# Altium footprint library SMD_Bauteile.PcbLib: 355 footprints (part 5 of 23)
Each footprint in its own frame and in the unit in brackets; x right, y up, seen from the top. Pads: shape width x height; smd on the part's side, far side on the other; paste and mask are expansions set on the pad; w line width, h text height; cw(c..) or ccw(c..) is an arc to the next point about the centre after c.
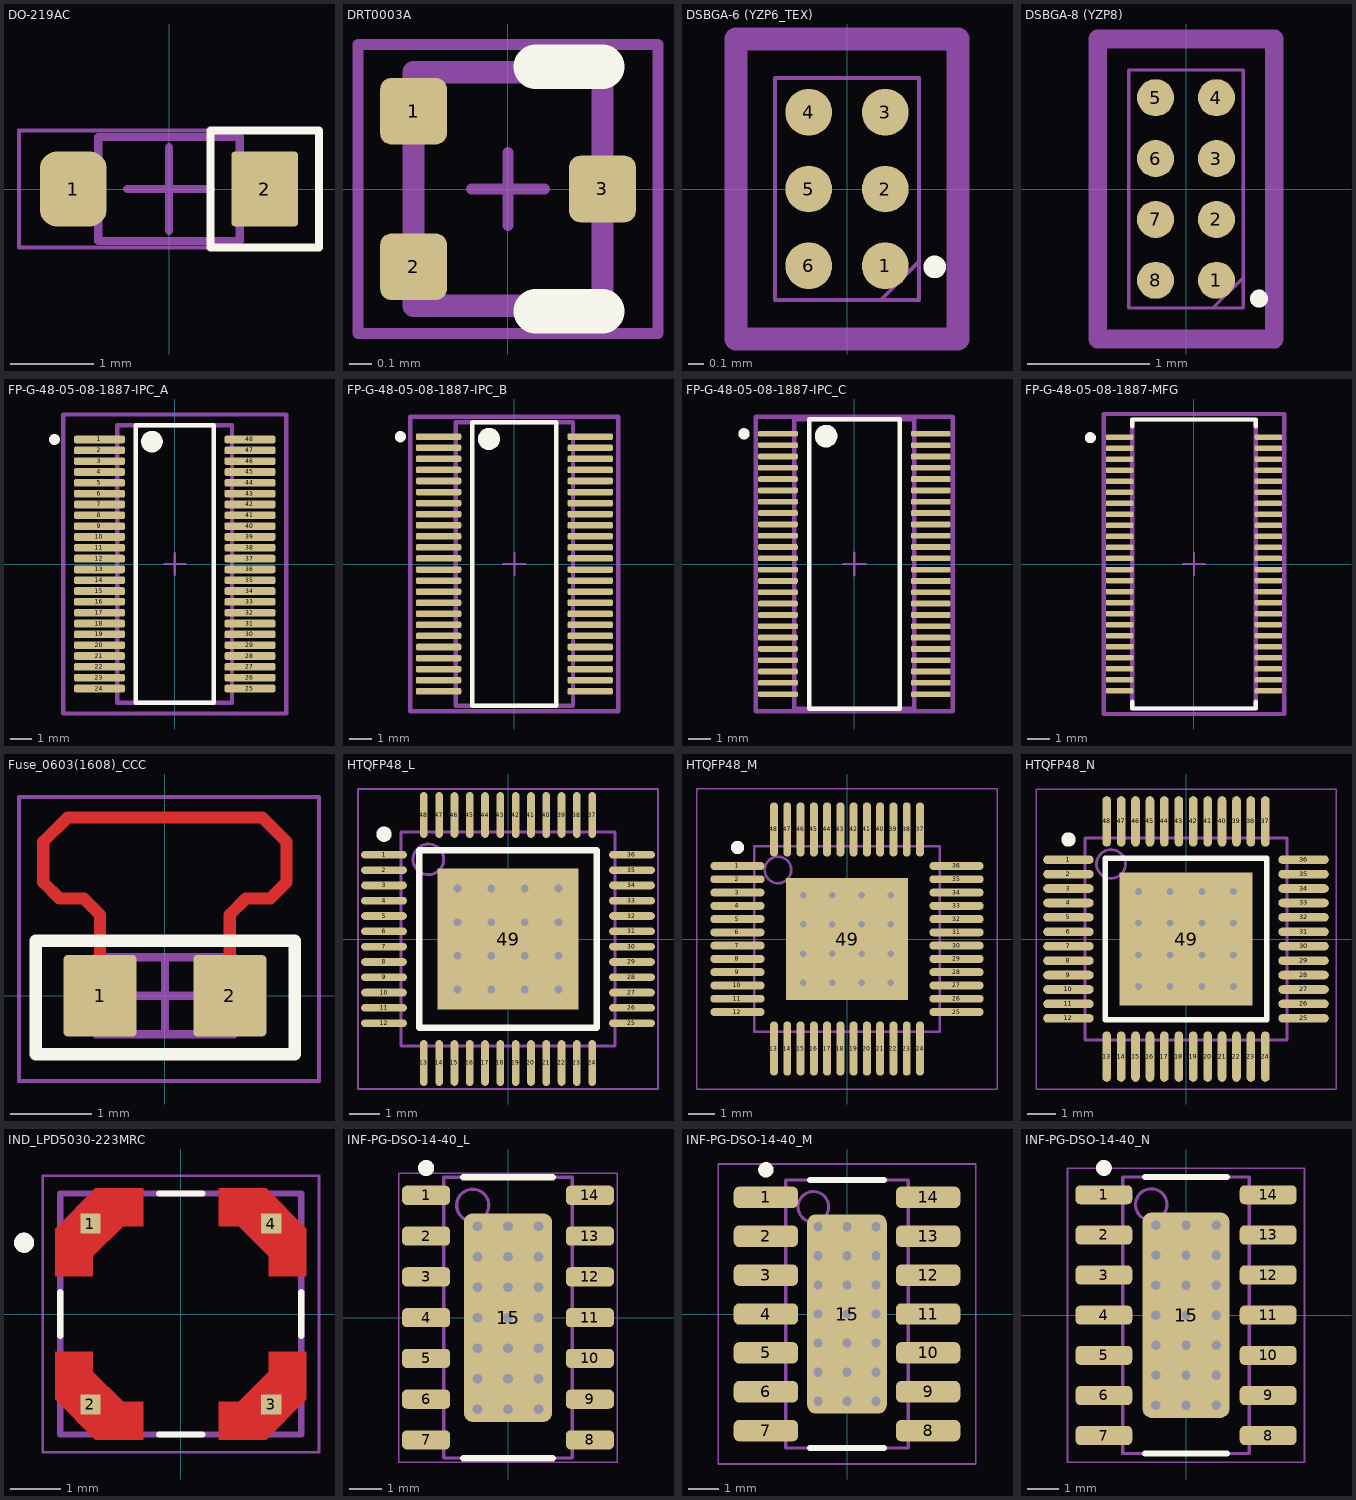
[diagram p4: the footprints below, top view; thin cyan lines are the x and y axes]

## DO-219AC [mm]
height 1.062
pads (2):
  rrect50% 0.8x0.9 smd: 1(-1.15,0)
  rrect10% 0.8x0.9 smd: 2(1.15,0)
Top Overlay:
  lines w0.1: 0.498,-0.702 1.802,-0.702 1.802,0.702 0.498,0.702 0.498,-0.702
Top Component Center:
  lines w0.1: -0.5,0 0.5,0 ; 0,-0.5 0,0.5
Top Component Outline:
  lines w0.1: -0.85,-0.625 -0.85,0.625 0.85,0.625 0.85,-0.625 -0.85,-0.625
Top Courtyard (Mech26):
  lines w0.05: -1.802,-0.702 -1.802,0.702 1.802,0.702 1.802,-0.702 -1.802,-0.702
3D body: height 0.6, standoff 0, extent -0.85,-0.625 0.85,0.625

## DRT0003A [mm] "SOTFL, 3-Leads, Body 1x1mm (inc leads), Pitch 0.35mm"
height 0.5
pads (3):
  rrect33% 0.3x0.3 smd: 1(-0.425,0.35) 2(-0.425,-0.35) 3(0.425,0)
Top Overlay:
  lines w0.2: 0.125,-0.55 0.425,-0.55 ; 0.125,0.55 0.425,0.55
Mechanical 1:
  text ".Designator" at -0.127,0.381 h0.2
Mech Misc 1:
  lines w0.1: -0.425,-0.525 -0.425,0.525 0.425,0.525 0.425,-0.525 -0.425,-0.525
Mech 15:
  lines w0.05: -0.165,0 0.165,0 ; 0,-0.165 0,0.165 ; -0.675,-0.65 0.675,-0.65 0.675,0.65 -0.675,0.65 -0.675,-0.65
3D body "SOTFL35P100X50-3L.step": height 0.5, standoff 0, extent -0.5,-0.498 0.5,0.498

## DSBGA-6 (YZP6_TEX) [mil]
height 19.68
pads (6):
  round 12 smd paste+0 mask+0: 1(9.84,-19.68) 2(9.84,0) 3(9.84,19.68) 4(-9.84,19.68) 5(-9.84,0) 6(-9.84,-19.68)
Top Overlay:
  circle w5: c22.5,-20 r0.39
Mech Misc 1:
  lines w1: 8.66,-28.5 18.5,-18.66 ; -18.5,-28.5 -18.5,28.5 18.5,28.5 18.5,-28.5 -18.5,-28.5
Mech 15:
  lines w6: -28.5,-38.5 28.5,-38.5 28.5,38.5 -28.5,38.5 -28.5,-38.5
3D body: height 10, standoff 0, extent 0,0 10,10
3D body "YZP6_TEX.step": height 20.12, standoff -0.02, extent -18.5,-28.5 18.51,28.51

## DSBGA-8 (YZP8) [mm]
height 0.5
pads (8):
  round 0.305 smd: 1(0.25,-0.75) 2(0.25,-0.25) 3(0.25,0.25) 4(0.25,0.75) 5(-0.25,0.75) 6(-0.25,0.25) 7(-0.25,-0.25) 8(-0.25,-0.75)
Top Overlay:
  circle w0.127: c0.6,-0.9 r0.01
Mech Misc 1:
  lines w0.025: 0.22,-0.978 0.47,-0.728 ; -0.47,-0.978 0.47,-0.978 0.47,0.978 -0.47,0.978 -0.47,-0.978
Mech 15:
  lines w0.152: -0.724,-1.232 -0.724,1.232 0.724,1.232 0.724,-1.232 -0.724,-1.232
3D body: height 0.25, standoff 0, extent 0,0 0.254,0.254
3D body "YZP8.step": height 0.51, standoff 0, extent -0.47,-0.978 0.47,0.978

## FP-G-48-05-08-1887-IPC_A [mm]
pads (48):
  rrect50% 2.353x0.355 smd: 1(-3.475,5.75) 2(-3.475,5.25) 3(-3.475,4.75) 4(-3.475,4.25) 5(-3.475,3.75) 6(-3.475,3.25) 7(-3.475,2.75) 8(-3.475,2.25) 9(-3.475,1.75) 10(-3.475,1.25) 11(-3.475,0.75) 12(-3.475,0.25) 13(-3.475,-0.25) 14(-3.475,-0.75) 15(-3.475,-1.25) 16(-3.475,-1.75) 17(-3.475,-2.25) 18(-3.475,-2.75) 19(-3.475,-3.25) 20(-3.475,-3.75) 21(-3.475,-4.25) 22(-3.475,-4.75) 23(-3.475,-5.25) 24(-3.475,-5.75) 25(3.475,-5.75) 26(3.475,-5.25) 27(3.475,-4.75) 28(3.475,-4.25) 29(3.475,-3.75) 30(3.475,-3.25) 31(3.475,-2.75) 32(3.475,-2.25) 33(3.475,-1.75) 34(3.475,-1.25) 35(3.475,-0.75) 36(3.475,-0.25) 37(3.475,0.25) 38(3.475,0.75) 39(3.475,1.25) 40(3.475,1.75) 41(3.475,2.25) 42(3.475,2.75) 43(3.475,3.25) 44(3.475,3.75) 45(3.475,4.25) 46(3.475,4.75) 47(3.475,5.25) 48(3.475,5.75)
Top Overlay:
  circle w0.25: c-5.552,5.75 r0.125
  circle w0.5: c-1.049,5.65 r0.25
  lines w0.2: -1.799,-6.4 -1.799,6.4 1.799,6.4 1.799,-6.4 -1.799,-6.4
Top Component Center:
  lines w0.1: -0.5,0 0.5,0 ; 0,-0.5 0,0.5
Top Component Outline:
  lines w0.2: -2.65,-6.4 -2.65,6.4 2.65,6.4 2.65,-6.4 -2.65,-6.4
Top Courtyard (Mech26):
  lines w0.2: -5.152,-6.9 -5.152,6.9 ; -5.152,-6.9 5.152,-6.9 ; -5.152,-6.9 -5.152,6.9 ; -5.152,-6.9 5.152,-6.9 ; -5.152,6.9 5.152,6.9 ; -5.152,6.9 5.152,6.9 ; 5.152,-6.9 5.152,6.9 ; 5.152,-6.9 5.152,6.9
Top Designator:
  text ".Designator" at 0,-0.001 h1
3D body "IC_Analog_Devices_LTC6811HG-1#PBF_eec.STEP": height 1.85, standoff 0, extent -3.9,-6.4 3.9,6.4

## FP-G-48-05-08-1887-IPC_B [mm]
pads (48):
  rrect50% 2.053x0.295 smd paste+0 mask+0.1: 1(-3.425,5.75) 2(-3.425,5.25) 3(-3.425,4.75) 4(-3.425,4.25) 5(-3.425,3.75) 6(-3.425,3.25) 7(-3.425,2.75) 8(-3.425,2.25) 9(-3.425,1.75) 10(-3.425,1.25) 11(-3.425,0.75) 12(-3.425,0.25) 13(-3.425,-0.25) 14(-3.425,-0.75) 15(-3.425,-1.25) 16(-3.425,-1.75) 17(-3.425,-2.25) 18(-3.425,-2.75) 19(-3.425,-3.25) 20(-3.425,-3.75) 21(-3.425,-4.25) 22(-3.425,-4.75) 23(-3.425,-5.25) 24(-3.425,-5.75) 25(3.425,-5.75) 26(3.425,-5.25) 27(3.425,-4.75) 28(3.425,-4.25) 29(3.425,-3.75) 30(3.425,-3.25) 31(3.425,-2.75) 32(3.425,-2.25) 33(3.425,-1.75) 34(3.425,-1.25) 35(3.425,-0.75) 36(3.425,-0.25) 37(3.425,0.25) 38(3.425,0.75) 39(3.425,1.25) 40(3.425,1.75) 41(3.425,2.25) 42(3.425,2.75) 43(3.425,3.25) 44(3.425,3.75) 45(3.425,4.25) 46(3.425,4.75) 47(3.425,5.25) 48(3.425,5.75)
Top Overlay:
  circle w0.25: c-5.152,5.75 r0.125
  circle w0.5: c-1.149,5.65 r0.25
  lines w0.2: -1.899,-6.4 -1.899,6.4 1.899,6.4 1.899,-6.4 -1.899,-6.4
Top Component Center:
  lines w0.1: -0.5,0 0.5,0 ; 0,-0.5 0,0.5
Top Component Outline:
  lines w0.2: -2.65,-6.4 2.65,-6.4 2.65,6.4 -2.65,6.4 -2.65,-6.4
Top Courtyard (Mech26):
  lines w0.2: -4.702,-6.65 -4.702,6.65 ; -4.702,-6.65 4.702,-6.65 ; -4.702,-6.65 -4.702,6.65 ; -4.702,-6.65 4.702,-6.65 ; -4.702,6.65 4.702,6.65 ; -4.702,6.65 4.702,6.65 ; 4.702,-6.65 4.702,6.65 ; 4.702,-6.65 4.702,6.65
Top Designator:
  text ".Designator" at 0,-0.001 h1
3D body "IC_Analog_Devices_LTC6811HG-1#PBF_eec.STEP": height 1.85, standoff 0, extent -3.9,-6.4 3.9,6.4

## FP-G-48-05-08-1887-IPC_C [mm]
pads (48):
  rrect50% 1.753x0.255 smd paste+0: 1(-3.375,5.75) 2(-3.375,5.25) 3(-3.375,4.75) 4(-3.375,4.25) 5(-3.375,3.75) 6(-3.375,3.25) 7(-3.375,2.75) 8(-3.375,2.25) 9(-3.375,1.75) 10(-3.375,1.25) 11(-3.375,0.75) 12(-3.375,0.25) 13(-3.375,-0.25) 14(-3.375,-0.75) 15(-3.375,-1.25) 16(-3.375,-1.75) 17(-3.375,-2.25) 18(-3.375,-2.75) 19(-3.375,-3.25) 20(-3.375,-3.75) 21(-3.375,-4.25) 22(-3.375,-4.75) 23(-3.375,-5.25) 24(-3.375,-5.75) 25(3.375,-5.75) 26(3.375,-5.25) 27(3.375,-4.75) 28(3.375,-4.25) 29(3.375,-3.75) 30(3.375,-3.25) 31(3.375,-2.75) 32(3.375,-2.25) 33(3.375,-1.75) 34(3.375,-1.25) 35(3.375,-0.75) 36(3.375,-0.25) 37(3.375,0.25) 38(3.375,0.75) 39(3.375,1.25) 40(3.375,1.75) 41(3.375,2.25) 42(3.375,2.75) 43(3.375,3.25) 44(3.375,3.75) 45(3.375,4.25) 46(3.375,4.75) 47(3.375,5.25) 48(3.375,5.75)
Top Overlay:
  circle w0.5: c-1.249,5.65 r0.25
  circle w0.25: c-4.877,5.75 r0.125
  lines w0.2: -1.999,-6.4 1.999,-6.4 1.999,6.4 -1.999,6.4 -1.999,-6.4
Top Component Center:
  lines w0.1: -0.5,0 0.5,0 ; 0,-0.5 0,0.5
Top Component Outline:
  lines w0.2: -2.65,-6.4 2.65,-6.4 2.65,6.4 -2.65,6.4 -2.65,-6.4
Top Courtyard (Mech26):
  lines w0.2: -4.352,-6.5 -4.352,6.5 ; -4.352,-6.5 4.352,-6.5 ; -4.352,-6.5 -4.352,6.5 ; -4.352,-6.5 4.352,-6.5 ; -4.352,6.5 4.352,6.5 ; -4.352,6.5 4.352,6.5 ; 4.352,-6.5 4.352,6.5 ; 4.352,-6.5 4.352,6.5
Top Designator:
  text ".Designator" at 0,-0.001 h1
3D body "IC_Analog_Devices_LTC6811HG-1#PBF_eec.STEP": height 1.85, standoff 0, extent -3.9,-6.4 3.9,6.4

## FP-G-48-05-08-1887-MFG [mm]
pads (48):
  rrect50% 1.25x0.25 smd paste+0: 1(-3.375,5.75) 2(-3.375,5.25) 3(-3.375,4.75) 4(-3.375,4.25) 5(-3.375,3.75) 6(-3.375,3.25) 7(-3.375,2.75) 8(-3.375,2.25) 9(-3.375,1.75) 10(-3.375,1.25) 11(-3.375,0.75) 12(-3.375,0.25) 13(-3.375,-0.25) 14(-3.375,-0.75) 15(-3.375,-1.25) 16(-3.375,-1.75) 17(-3.375,-2.25) 18(-3.375,-2.75) 19(-3.375,-3.25) 20(-3.375,-3.75) 21(-3.375,-4.25) 22(-3.375,-4.75) 23(-3.375,-5.25) 24(-3.375,-5.75) 25(3.375,-5.75) 26(3.375,-5.25) 27(3.375,-4.75) 28(3.375,-4.25) 29(3.375,-3.75) 30(3.375,-3.25) 31(3.375,-2.75) 32(3.375,-2.25) 33(3.375,-1.75) 34(3.375,-1.25) 35(3.375,-0.75) 36(3.375,-0.25) 37(3.375,0.25) 38(3.375,0.75) 39(3.375,1.25) 40(3.375,1.75) 41(3.375,2.25) 42(3.375,2.75) 43(3.375,3.25) 44(3.375,3.75) 45(3.375,4.25) 46(3.375,4.75) 47(3.375,5.25) 48(3.375,5.75)
Top Overlay:
  circle w0.25: c-4.7,5.725 r0.125
  lines w0.2: -2.8,-6.25 -2.8,-6.55 2.8,-6.55 2.8,-6.25 ; -2.8,6.25 -2.8,6.55 2.8,6.55 2.8,6.25
Top Component Center:
  lines w0.1: -0.5,0 0.5,0 ; 0,-0.5 0,0.5
Top Component Outline:
  lines w0.2: -2.8,-6.55 2.8,-6.55 2.8,6.55 -2.8,6.55 -2.8,-6.55
Top Courtyard (Mech26):
  lines w0.2: -4.1,-6.8 -4.1,6.8 ; -4.1,-6.8 4.1,-6.8 ; -4.1,-6.8 -4.1,6.8 ; -4.1,-6.8 4.1,-6.8 ; -4.1,6.8 4.1,6.8 ; -4.1,6.8 4.1,6.8 ; 4.1,-6.8 4.1,6.8 ; 4.1,-6.8 4.1,6.8
Top Designator:
  text ".Designator" at 0,0.187 h1
3D body "IC_Analog_Devices_LTC6811HG-1#PBF_eec.STEP": height 1.85, standoff 0, extent -3.9,-6.4 3.9,6.4

## Fuse_0603(1608)_CCC [mm] "Chip Fuse for CCC, 2-Leads, Body 1.60x0.85mm, IPC Low Density"
height 0.55
pads (2):
  rrect10% 0.9x1 smd paste-2539.97: 1(-0.8,0) 2(0.8,0)
Top Layer:
  lines w0.15: -0.8,0 -0.8,1 -1,1.2 -1.3,1.2 -1.5,1.4 -1.5,1.9 -1.2,2.2 1.2,2.2 1.5,1.9 1.5,1.4 1.3,1.2 1,1.2 0.8,1 0.8,0
Top Overlay:
  lines w0.15: -1.593,-0.722 1.6,-0.722 1.6,0.678 -1.593,0.678 -1.593,-0.722
Mech Misc 1:
  lines w0.1: -0.85,-0.475 0.85,-0.475 0.85,0.475 -0.85,0.475 -0.85,-0.475
Mech 15:
  lines w0.05: -1.8,-1.05 -1.8,2.45 1.9,2.45 1.9,-1.05 -1.8,-1.05
  lines w0.1: -0.475,0 0.475,0 ; 0,-0.475 0,0.475
3D body "0438.250WR_simplify.stp": height 0.58, standoff 0, extent -0.77,-0.425 0.77,0.425

## HTQFP48_L [mm] "QFP, 48-Leads, Body 7x7mm, Pitch 0.5mm, Thermal Pad 4.6x4.6mm, IPC High Density"
height 1.2
pads (49):
  oval 1.5x0.25 smd: 1(-4.05,2.75) 2(-4.05,2.25) 3(-4.05,1.75) 4(-4.05,1.25) 5(-4.05,0.75) 6(-4.05,0.25) 7(-4.05,-0.25) 8(-4.05,-0.75) 9(-4.05,-1.25) 10(-4.05,-1.75) 11(-4.05,-2.25) 12(-4.05,-2.75) 25(4.05,-2.75) 26(4.05,-2.25) 27(4.05,-1.75) 28(4.05,-1.25) 29(4.05,-0.75) 30(4.05,-0.25) 31(4.05,0.25) 32(4.05,0.75) 33(4.05,1.25) 34(4.05,1.75) 35(4.05,2.25) 36(4.05,2.75)
  oval 0.25x1.5 smd: 13(-2.75,-4.05) 14(-2.25,-4.05) 15(-1.75,-4.05) 16(-1.25,-4.05) 17(-0.75,-4.05) 18(-0.25,-4.05) 19(0.25,-4.05) 20(0.75,-4.05) 21(1.25,-4.05) 22(1.75,-4.05) 23(2.25,-4.05) 24(2.75,-4.05) 37(2.75,4.05) 38(2.25,4.05) 39(1.75,4.05) 40(1.25,4.05) 41(0.75,4.05) 42(0.25,4.05) 43(-0.25,4.05) 44(-0.75,4.05) 45(-1.25,4.05) 46(-1.75,4.05) 47(-2.25,4.05) 48(-2.75,4.05)
  rect 4.6x4.6 smd: 49(0,0)
via -1.65,1.65 diameter 0.6 hole 0.25
via -0.55,1.65 diameter 0.6 hole 0.25
via 0.55,1.65 diameter 0.6 hole 0.25
via 1.65,1.65 diameter 0.6 hole 0.25
via -1.65,0.55 diameter 0.6 hole 0.25
via -0.55,0.55 diameter 0.6 hole 0.25
via 0.55,0.55 diameter 0.6 hole 0.25
via 1.65,0.55 diameter 0.6 hole 0.25
via -1.65,-0.55 diameter 0.6 hole 0.25
via -0.55,-0.55 diameter 0.6 hole 0.25
via 0.55,-0.55 diameter 0.6 hole 0.25
via 1.65,-0.55 diameter 0.6 hole 0.25
via -1.65,-1.65 diameter 0.6 hole 0.25
via -0.55,-1.65 diameter 0.6 hole 0.25
via 0.55,-1.65 diameter 0.6 hole 0.25
via 1.65,-1.65 diameter 0.6 hole 0.25
Top Overlay:
  circle w0.25: c-4.05,3.425 r0.125
  lines w0.2: -2.9,-2.9 -2.9,2.9 2.9,2.9 2.9,-2.9 -2.9,-2.9
Mech Misc 1:
  circle w0.1: c-2.6,2.6 r0.5
  lines w0.1: -3.5,-3.5 -3.5,3.5 3.5,3.5 3.5,-3.5 -3.5,-3.5
Mech 15:
  lines w0.05: -4.9,-4.9 -4.9,4.9 4.9,4.9 4.9,-4.9 -4.9,-4.9
  lines w0.1: -0.5,0 0.5,0 ; 0,-0.5 0,0.5
3D body: height 1.2, standoff 0.05, extent -3.5,-3.5 3.5,3.5

## HTQFP48_M [mm] "QFP, 48-Leads, Body 7x7mm, Pitch 0.5mm, Thermal Pad 4.6x4.6mm, IPC Low Density"
height 1.2
pads (49):
  oval 2.05x0.3 smd: 1(-4.125,2.75) 2(-4.125,2.25) 3(-4.125,1.75) 4(-4.125,1.25) 5(-4.125,0.75) 6(-4.125,0.25) 7(-4.125,-0.25) 8(-4.125,-0.75) 9(-4.125,-1.25) 10(-4.125,-1.75) 11(-4.125,-2.25) 12(-4.125,-2.75) 25(4.125,-2.75) 26(4.125,-2.25) 27(4.125,-1.75) 28(4.125,-1.25) 29(4.125,-0.75) 30(4.125,-0.25) 31(4.125,0.25) 32(4.125,0.75) 33(4.125,1.25) 34(4.125,1.75) 35(4.125,2.25) 36(4.125,2.75)
  oval 0.3x2.05 smd: 13(-2.75,-4.125) 14(-2.25,-4.125) 15(-1.75,-4.125) 16(-1.25,-4.125) 17(-0.75,-4.125) 18(-0.25,-4.125) 19(0.25,-4.125) 20(0.75,-4.125) 21(1.25,-4.125) 22(1.75,-4.125) 23(2.25,-4.125) 24(2.75,-4.125) 37(2.75,4.125) 38(2.25,4.125) 39(1.75,4.125) 40(1.25,4.125) 41(0.75,4.125) 42(0.25,4.125) 43(-0.25,4.125) 44(-0.75,4.125) 45(-1.25,4.125) 46(-1.75,4.125) 47(-2.25,4.125) 48(-2.75,4.125)
  rect 4.6x4.6 smd: 49(0,0)
via -1.65,1.65 diameter 0.6 hole 0.25
via -0.55,1.65 diameter 0.6 hole 0.25
via 0.55,1.65 diameter 0.6 hole 0.25
via 1.65,1.65 diameter 0.6 hole 0.25
via -1.65,0.55 diameter 0.6 hole 0.25
via -0.55,0.55 diameter 0.6 hole 0.25
via 0.55,0.55 diameter 0.6 hole 0.25
via 1.65,0.55 diameter 0.6 hole 0.25
via -1.65,-0.55 diameter 0.6 hole 0.25
via -0.55,-0.55 diameter 0.6 hole 0.25
via 0.55,-0.55 diameter 0.6 hole 0.25
via 1.65,-0.55 diameter 0.6 hole 0.25
via -1.65,-1.65 diameter 0.6 hole 0.25
via -0.55,-1.65 diameter 0.6 hole 0.25
via 0.55,-1.65 diameter 0.6 hole 0.25
via 1.65,-1.65 diameter 0.6 hole 0.25
Top Overlay:
  circle w0.25: c-4.125,3.45 r0.125
Mech Misc 1:
  circle w0.1: c-2.6,2.6 r0.5
  lines w0.1: -3.5,-3.5 -3.5,3.5 3.5,3.5 3.5,-3.5 -3.5,-3.5
Mech 15:
  lines w0.05: -5.65,-5.65 -5.65,5.65 5.65,5.65 5.65,-5.65 -5.65,-5.65
  lines w0.1: -0.5,0 0.5,0 ; 0,-0.5 0,0.5
3D body: height 1.2, standoff 0.05, extent -3.5,-3.5 3.5,3.5

## HTQFP48_N [mm] "QFP, 48-Leads, Body 7x7mm, Pitch 0.5mm, Thermal Pad 4.6x4.6mm, IPC Medium Density"
height 1.2
pads (49):
  oval 1.75x0.3 smd: 1(-4.075,2.75) 2(-4.075,2.25) 3(-4.075,1.75) 4(-4.075,1.25) 5(-4.075,0.75) 6(-4.075,0.25) 7(-4.075,-0.25) 8(-4.075,-0.75) 9(-4.075,-1.25) 10(-4.075,-1.75) 11(-4.075,-2.25) 12(-4.075,-2.75) 25(4.075,-2.75) 26(4.075,-2.25) 27(4.075,-1.75) 28(4.075,-1.25) 29(4.075,-0.75) 30(4.075,-0.25) 31(4.075,0.25) 32(4.075,0.75) 33(4.075,1.25) 34(4.075,1.75) 35(4.075,2.25) 36(4.075,2.75)
  oval 0.3x1.75 smd: 13(-2.75,-4.075) 14(-2.25,-4.075) 15(-1.75,-4.075) 16(-1.25,-4.075) 17(-0.75,-4.075) 18(-0.25,-4.075) 19(0.25,-4.075) 20(0.75,-4.075) 21(1.25,-4.075) 22(1.75,-4.075) 23(2.25,-4.075) 24(2.75,-4.075) 37(2.75,4.075) 38(2.25,4.075) 39(1.75,4.075) 40(1.25,4.075) 41(0.75,4.075) 42(0.25,4.075) 43(-0.25,4.075) 44(-0.75,4.075) 45(-1.25,4.075) 46(-1.75,4.075) 47(-2.25,4.075) 48(-2.75,4.075)
  rect 4.6x4.6 smd: 49(0,0)
via -1.65,1.65 diameter 0.6 hole 0.25
via -0.55,1.65 diameter 0.6 hole 0.25
via 0.55,1.65 diameter 0.6 hole 0.25
via 1.65,1.65 diameter 0.6 hole 0.25
via -1.65,0.55 diameter 0.6 hole 0.25
via -0.55,0.55 diameter 0.6 hole 0.25
via 0.55,0.55 diameter 0.6 hole 0.25
via 1.65,0.55 diameter 0.6 hole 0.25
via -1.65,-0.55 diameter 0.6 hole 0.25
via -0.55,-0.55 diameter 0.6 hole 0.25
via 0.55,-0.55 diameter 0.6 hole 0.25
via 1.65,-0.55 diameter 0.6 hole 0.25
via -1.65,-1.65 diameter 0.6 hole 0.25
via -0.55,-1.65 diameter 0.6 hole 0.25
via 0.55,-1.65 diameter 0.6 hole 0.25
via 1.65,-1.65 diameter 0.6 hole 0.25
Top Overlay:
  circle w0.25: c-4.075,3.45 r0.125
  lines w0.2: -2.8,-2.8 -2.8,2.8 2.8,2.8 2.8,-2.8 -2.8,-2.8
Mech Misc 1:
  circle w0.1: c-2.6,2.6 r0.5
  lines w0.1: -3.5,-3.5 -3.5,3.5 3.5,3.5 3.5,-3.5 -3.5,-3.5
Mech 15:
  lines w0.05: -5.2,-5.2 -5.2,5.2 5.2,5.2 5.2,-5.2 -5.2,-5.2
  lines w0.1: -0.5,0 0.5,0 ; 0,-0.5 0,0.5
3D body: height 1.2, standoff 0.05, extent -3.5,-3.5 3.5,3.5

## IND_LPD5030-223MRC [mm]
pads (4):
  rect 0.4x0.4 smd paste-1 mask+0: 1(-1.8,1.8) 2(-1.8,-1.8) 3(1.8,-1.8) 4(1.8,1.8)
Top Layer:
  region: -1.75,-1.15 -1.15,-1.75 -0.75,-1.75 -0.75,-2.5 -1.7,-2.5 -2.5,-1.7 -2.5,-0.75 -1.75,-0.75
  region: 2.5,-1.7 1.7,-2.5 0.75,-2.5 0.75,-1.75 1.15,-1.75 1.75,-1.15 1.75,-0.75 2.5,-0.75
  region: 2.5,1.7 2.5,0.75 1.75,0.75 1.75,1.15 1.15,1.75 0.75,1.75 0.75,2.5 1.7,2.5
  region: -0.75,1.75 -1.15,1.75 -1.75,1.15 -1.75,0.75 -2.5,0.75 -2.5,1.7 -1.7,2.5 -0.75,2.5
Top Overlay:
  circle w0.2: c-3.123,1.419 r0.1
  lines w0.127: -2.4,-0.43 -2.4,0.43 ; -0.43,-2.4 0.43,-2.4 ; -0.43,2.4 0.43,2.4 ; 2.4,-0.43 2.4,0.43
Top Paste:
  region: -1.75,-1.15 -1.15,-1.75 -0.75,-1.75 -0.75,-2.5 -1.7,-2.5 -2.5,-1.7 -2.5,-0.75 -1.75,-0.75
  region: 2.5,-1.7 1.7,-2.5 0.75,-2.5 0.75,-1.75 1.15,-1.75 1.75,-1.15 1.75,-0.75 2.5,-0.75
  region: 2.5,1.7 2.5,0.75 1.75,0.75 1.75,1.15 1.15,1.75 0.75,1.75 0.75,2.5 1.7,2.5
  region: -0.75,1.75 -1.15,1.75 -1.75,1.15 -1.75,0.75 -2.5,0.75 -2.5,1.7 -1.7,2.5 -0.75,2.5
Top Solder:
  region: -1.65,-1.109 -1.109,-1.65 -0.65,-1.65 -0.65,-2.6 -1.741,-2.6 -2.6,-1.741 -2.6,-0.65 -1.65,-0.65
  region: 2.6,-1.741 1.741,-2.6 0.65,-2.6 0.65,-1.65 1.109,-1.65 1.65,-1.109 1.65,-0.65 2.6,-0.65
  region: 2.6,1.741 2.6,0.65 1.65,0.65 1.65,1.109 1.109,1.65 0.65,1.65 0.65,2.6 1.741,2.6
  region: -0.65,1.65 -1.109,1.65 -1.65,1.109 -1.65,0.65 -2.6,0.65 -2.6,1.741 -1.741,2.6 -0.65,2.6
Mech Misc 1:
  circle w0.2: c-3.123,1.419 r0.1
  lines w0.127: -2.4,-2.4 -2.4,2.4 2.4,2.4 2.4,-2.4 -2.4,-2.4
Mech 15:
  lines w0.05: -2.75,-2.75 2.75,-2.75 2.75,2.75 -2.75,2.75 -2.75,-2.75

## INF-PG-DSO-14-40_L [mm] "SOP, 14-Leads, Body 8.65x3.9mm, Pitch 1.27mm, Thermal Pad 6.5x2.75mm, IPC High Density"
height 1.7
pads (15):
  rrect50% 1.5x0.6 smd: 1(-2.55,3.81) 2(-2.55,2.54) 3(-2.55,1.27) 4(-2.55,0) 5(-2.55,-1.27) 6(-2.55,-2.54) 7(-2.55,-3.81) 8(2.55,-3.81) 9(2.55,-2.54) 10(2.55,-1.27) 11(2.55,0) 12(2.55,1.27) 13(2.55,2.54) 14(2.55,3.81)
  rrect20% 2.75x6.5 smd: 15(0,0)
via -0.95,2.85 diameter 0.7 hole 0.3
via 0,2.85 diameter 0.7 hole 0.3
via 0.95,0.95 diameter 0.7 hole 0.3
via -0.95,-2.85 diameter 0.7 hole 0.3
via -0.95,-1.9 diameter 0.7 hole 0.3
via -0.95,0 diameter 0.7 hole 0.3
via -0.95,0.95 diameter 0.7 hole 0.3
via -0.95,1.9 diameter 0.7 hole 0.3
via 0,1.9 diameter 0.7 hole 0.3
via 0,0.95 diameter 0.7 hole 0.3
via 0,-1.9 diameter 0.7 hole 0.3
via 0,-2.85 diameter 0.7 hole 0.3
via 0.95,-2.85 diameter 0.7 hole 0.3
via 0.95,-1.9 diameter 0.7 hole 0.3
via 0.95,2.85 diameter 0.7 hole 0.3
via 0.95,1.9 diameter 0.7 hole 0.3
via 0,-0.95 diameter 0.7 hole 0.3
via 0,0 diameter 0.7 hole 0.3
via -0.95,-0.95 diameter 0.7 hole 0.3
via 0.95,-0.95 diameter 0.7 hole 0.3
via 0.95,0 diameter 0.7 hole 0.3
Top Overlay:
  circle w0.25: c-2.55,4.66 r0.125
  lines w0.2: -1.4,-4.375 1.4,-4.375 ; -1.4,4.375 1.4,4.375
Top Component Center:
  lines w0.1: -0.5,0 0.5,0 ; 0,-0.5 0,0.5
Top Component Outline:
  circle w0.1: c-1.1,3.5 r0.5
  lines w0.1: -2,-4.375 2,-4.375 2,4.375 -2,4.375 -2,-4.375
Top Courtyard (Mech26):
  lines w0.05: -3.4,-4.5 3.4,-4.5 3.4,4.5 -3.4,4.5 -3.4,-4.5
3D body: height 1.7, standoff 0, extent -2,-4.375 2,4.375

## INF-PG-DSO-14-40_M [mm] "SOP, 14-Leads, Body 8.65x3.9mm, Pitch 1.27mm, Thermal Pad 6.5x2.6mm, IPC Low Density"
height 1.7
pads (15):
  rrect50% 2.1x0.7 smd: 1(-2.65,3.81) 2(-2.65,2.54) 3(-2.65,1.27) 4(-2.65,0) 5(-2.65,-1.27) 6(-2.65,-2.54) 7(-2.65,-3.81) 8(2.65,-3.81) 9(2.65,-2.54) 10(2.65,-1.27) 11(2.65,0) 12(2.65,1.27) 13(2.65,2.54) 14(2.65,3.81)
  rrect20% 2.6x6.5 smd: 15(0,0)
via -0.95,2.85 diameter 0.7 hole 0.3
via 0,2.85 diameter 0.7 hole 0.3
via 0.95,0.95 diameter 0.7 hole 0.3
via -0.95,-2.85 diameter 0.7 hole 0.3
via -0.95,-1.9 diameter 0.7 hole 0.3
via -0.95,0 diameter 0.7 hole 0.3
via -0.95,0.95 diameter 0.7 hole 0.3
via -0.95,1.9 diameter 0.7 hole 0.3
via 0,1.9 diameter 0.7 hole 0.3
via 0,0.95 diameter 0.7 hole 0.3
via 0,-1.9 diameter 0.7 hole 0.3
via 0,-2.85 diameter 0.7 hole 0.3
via 0.95,-2.85 diameter 0.7 hole 0.3
via 0.95,-1.9 diameter 0.7 hole 0.3
via 0.95,2.85 diameter 0.7 hole 0.3
via 0.95,1.9 diameter 0.7 hole 0.3
via 0,-0.95 diameter 0.7 hole 0.3
via 0,0 diameter 0.7 hole 0.3
via -0.95,-0.95 diameter 0.7 hole 0.3
via 0.95,-0.95 diameter 0.7 hole 0.3
via 0.95,0 diameter 0.7 hole 0.3
Top Overlay:
  circle w0.25: c-2.65,4.71 r0.125
  lines w0.2: -1.2,-4.375 1.2,-4.375 ; -1.2,4.375 1.2,4.375
Top Component Center:
  lines w0.1: -0.5,0 0.5,0 ; 0,-0.5 0,0.5
Top Component Outline:
  circle w0.1: c-1.1,3.5 r0.5
  lines w0.1: -2,-4.375 2,-4.375 2,4.375 -2,4.375 -2,-4.375
Top Courtyard (Mech26):
  lines w0.05: -4.2,-4.9 -4.2,4.9 4.2,4.9 4.2,-4.9 -4.2,-4.9
3D body: height 1.7, standoff 0, extent -2,-4.375 2,4.375

## INF-PG-DSO-14-40_N [mm] "SOP, 14-Leads, Body 8.65x3.9mm, Pitch 1.27mm, Thermal Pad 6.5x2.75mm, IPC Medium Density"
height 1.7
pads (15):
  rrect50% 1.8x0.6 smd: 1(-2.6,3.81) 2(-2.6,2.54) 3(-2.6,1.27) 4(-2.6,0) 5(-2.6,-1.27) 6(-2.6,-2.54) 7(-2.6,-3.81) 8(2.6,-3.81) 9(2.6,-2.54) 10(2.6,-1.27) 11(2.6,0) 12(2.6,1.27) 13(2.6,2.54) 14(2.6,3.81)
  rrect20% 2.75x6.5 smd: 15(0,0)
via -0.95,2.85 diameter 0.7 hole 0.3
via 0,2.85 diameter 0.7 hole 0.3
via 0.95,0.95 diameter 0.7 hole 0.3
via -0.95,-2.85 diameter 0.7 hole 0.3
via -0.95,-1.9 diameter 0.7 hole 0.3
via -0.95,0 diameter 0.7 hole 0.3
via -0.95,0.95 diameter 0.7 hole 0.3
via -0.95,1.9 diameter 0.7 hole 0.3
via 0,1.9 diameter 0.7 hole 0.3
via 0,0.95 diameter 0.7 hole 0.3
via 0,-1.9 diameter 0.7 hole 0.3
via 0,-2.85 diameter 0.7 hole 0.3
via 0.95,-2.85 diameter 0.7 hole 0.3
via 0.95,-1.9 diameter 0.7 hole 0.3
via 0.95,2.85 diameter 0.7 hole 0.3
via 0.95,1.9 diameter 0.7 hole 0.3
via 0,-0.95 diameter 0.7 hole 0.3
via 0,0 diameter 0.7 hole 0.3
via -0.95,-0.95 diameter 0.7 hole 0.3
via 0.95,-0.95 diameter 0.7 hole 0.3
via 0.95,0 diameter 0.7 hole 0.3
Top Overlay:
  circle w0.25: c-2.6,4.66 r0.125
  lines w0.2: -1.3,-4.375 1.3,-4.375 ; -1.3,4.375 1.3,4.375
Top Component Center:
  lines w0.1: -0.5,0 0.5,0 ; 0,-0.5 0,0.5
Top Component Outline:
  circle w0.1: c-1.1,3.5 r0.5
  lines w0.1: -2,-4.375 -2,4.375 2,4.375 2,-4.375 -2,-4.375
Top Courtyard (Mech26):
  lines w0.05: -3.75,-4.65 3.75,-4.65 3.75,4.65 -3.75,4.65 -3.75,-4.65
3D body: height 1.7, standoff 0, extent -2,-4.375 2,4.375